# Altium footprint library connectors.PCBLIB: 188 footprints (part 10 of 12)
Each footprint in its own frame and in the unit in brackets; x right, y up, seen from the top. Pads: shape width x height; smd on the part's side, far side on the other; paste and mask are expansions set on the pad; w line width, h text height; cw(c..) or ccw(c..) is an arc to the next point about the centre after c.
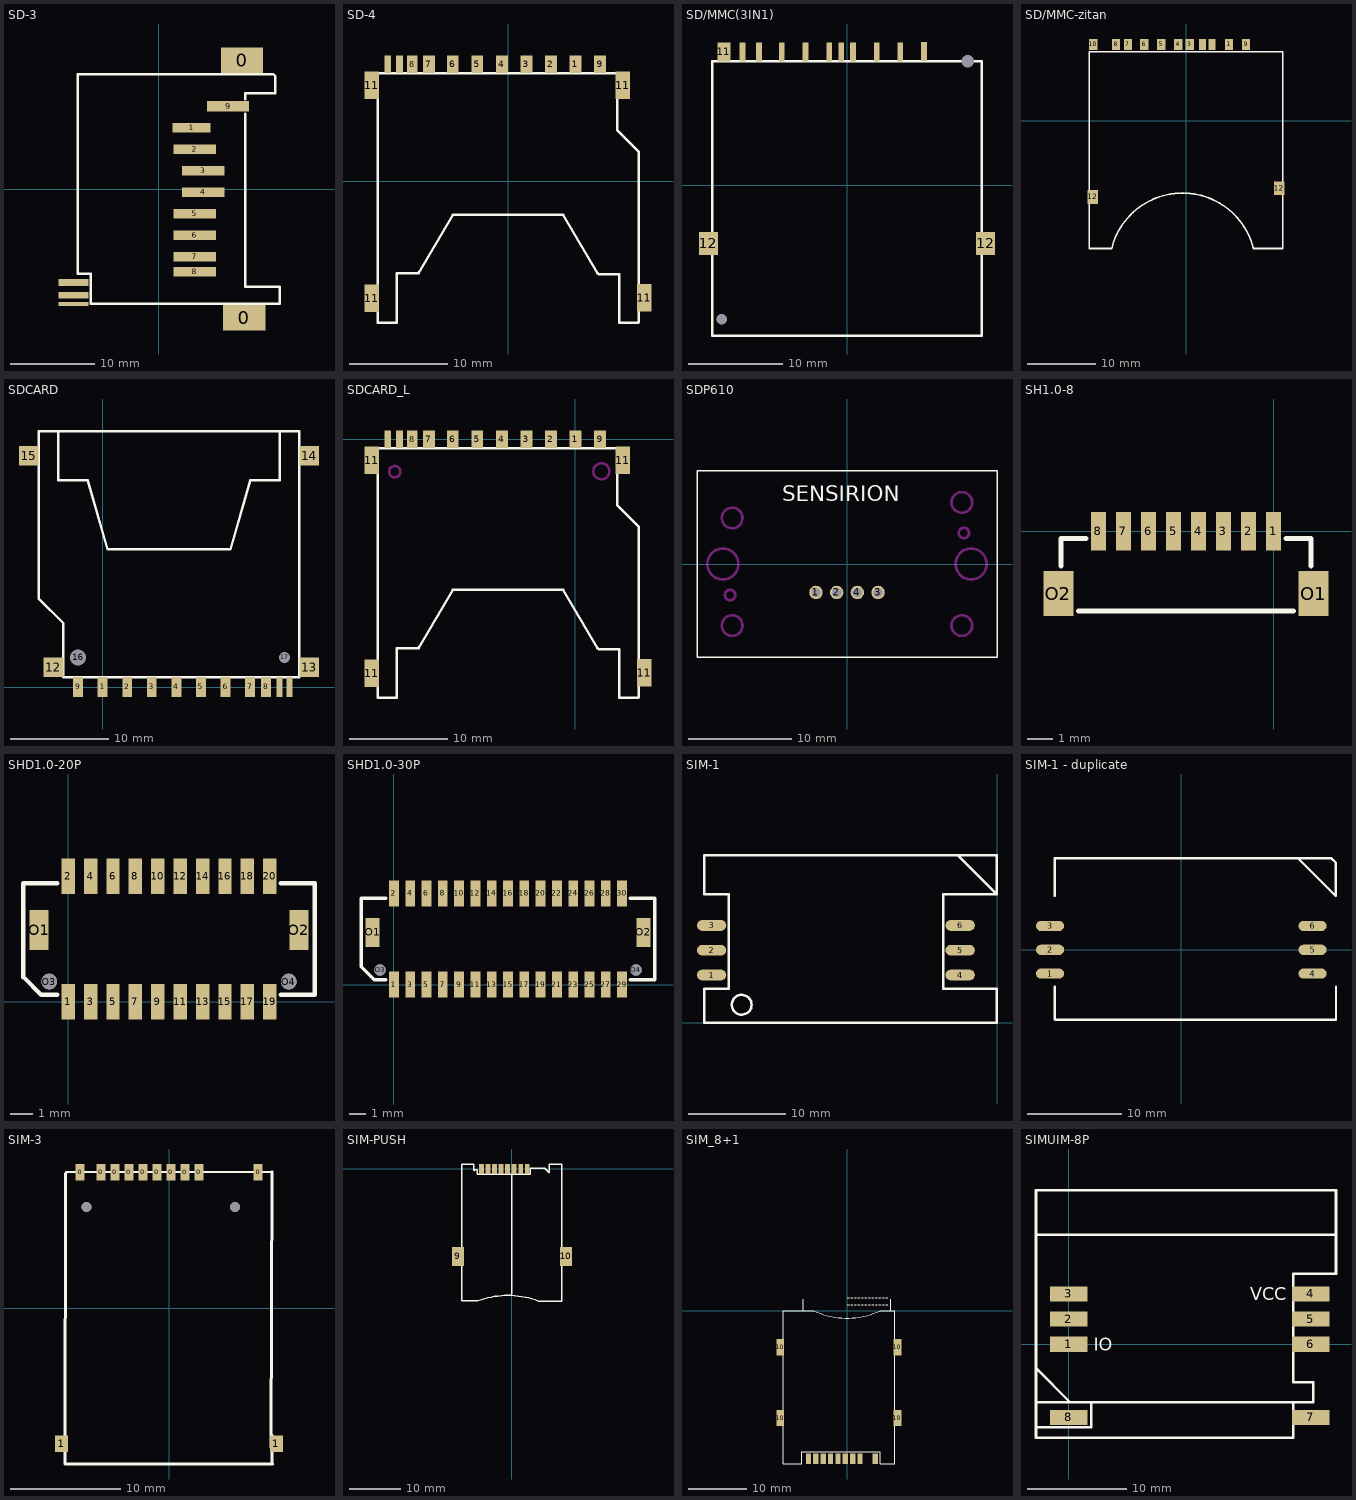
[diagram p9: the footprints below, top view; thin cyan lines are the x and y axes]

## SD-3 [mm]
pads (14):
  rect 5x3 smd: 0(9.843,15.24) 0(10.097,-15.24)
  rect 4.5x1.143 smd: 1(3.874,7.239)
  rect 5x1.143 smd: 2(4.255,4.699) 3(5.271,2.159) 4(5.271,-0.381) 5(4.255,-2.921) 6(4.255,-5.461) 7(4.255,-8.001) 8(4.255,-9.779)
  rect 5x1.27 smd: 9(8.192,9.779)
  rect 3.556x0.8 smd: 10(-10.097,-11.049) 11(-10.097,-12.573)
  rect 3.556x0.5 smd: 12(-10.097,-13.589)
Top Overlay:
  lines w0.3: 7.683,-13.589 14.287,-13.589 14.287,-11.557 10.223,-11.557 10.223,8.889 ; 8.191,-13.589 -8.065,-13.589 -8.065,-10.033 -9.589,-10.033 -9.589,13.589 8.191,13.589 13.525,13.589 13.779,13.335 13.779,11.303 10.223,11.303 10.223,10.59

## SD-4 [mm]
pads (15):
  rect 1.2x1.8 smd: 1(6.858,11.917) 2(4.369,11.917) 3(1.875,11.908) 4(-0.625,11.908) 5(-3.125,11.908) 6(-5.625,11.908) 7(-8.05,11.908) 9(9.375,11.908)
  rect 1.1x1.8 smd: 8(-9.754,11.917)
  rect 0.7x1.8 smd: 10(-11.05,11.908) 12(-12.243,11.917)
  rect 1.5x2.8 smd: 11(-13.868,-11.917) 11(-13.868,9.774) 11(11.684,9.774) 11(13.868,-11.866)
Top Overlay:
  lines w0.254: -11.3,-9.383 -11.3,-14.383 -13.273,-14.383 -13.273,11.003 -13.259,11.017 11.1,11.017 11.1,5.207 13.289,3.018 13.3,3.018 13.3,-14.356 13.273,-14.383 11.3,-14.383 11.3,-9.484 9.258,-9.484 9.1,-9.326 ; -11.249,-9.377 -9.207,-9.377 -9.049,-9.219 ; -9.1,-9.377 -5.588,-3.383 ; -5.6,-3.383 5.6,-3.383 9.1,-9.377
Multi-Layer:
  circle w0.254: c9.5,8.657 r0.82
  circle w0.254: c-11.532,8.617 r0.58

## SD/MMC(3IN1) [mm]
pads (15):
  rect 0.6x2 smd: 1(8.13,14.133) 2(5.63,14.101) 3(3.13,14.101) 4(0.63,14.101) 5(-0.62,14.101) 6(-1.88,14.101) 7(-4.38,14.101) 8(-6.88,14.101) 9(-9.3,14.101) 10(-11.05,14.101)
  rect 1.4x2 smd: 11(-13,14.101)
  rect 2x2.4 smd: 12(-14.65,-6.133) 12(14.65,-6.133)
  round 1.05 hole 1.1: ""(-13.25,-14.133)
  round 1.25 hole 1.3: ""(12.75,13.12)
Top Overlay:
  lines w0.254: -14.251,-15.899 14.249,-15.899 14.249,13.101 -1.251,13.101 -14.251,13.101 -14.251,-15.899

## SD/MMC-zitan [mm]
pads (13):
  rect 1.2x1.6 smd: 1(6.35,11.25) 3(0.55,11.25) 4(-1.15,11.25) 5(-3.65,11.25) 6(-6.15,11.25) 7(-8.575,11.25) 8(-10.3,11.25) 9(8.85,11.25) 10(-13.68,11.25)
  rect 1x1.6 smd: 2(3.85,11.25) 11(2.45,11.25)
  rect 1.5x2 smd: 12(-13.75,-11.25) 12(13.75,-9.95)
Top Overlay:
  lines w0.254: -10.964,-18.871 cw(c-0.508,-21.427) 9.943,-18.85 ; -10.964,-18.85 -14.28,-18.85 -14.28,10.15 14.28,10.15 14.28,-18.85 9.943,-18.85
Multi-Layer:
  circle w0.127: c11.7,-13.35 r0.85
  circle w0.127: c-12.6,-13.35 r0.85

## SDCARD [mm]
pads (17):
  rect 1x2 smd: 1(0.007,0.016) 2(2.507,0.016) 3(5.007,0.016) 4(7.507,0.016) 5(10.007,0.016) 6(12.507,0.016) 7(15.007,0.016) 8(16.632,0.016) 9(-2.493,0.016)
  rect 0.6x2 smd: 10(19.007,0.016) 11(18.007,0.016)
  rect 2x2 smd: 12(-4.993,2.016) 13(21.007,2.016) 14(21.007,23.516) 15(-7.493,23.516)
  round 1.5 hole 1.6: 16(-2.493,3.016)
  round 1 hole 1.1: 17(18.507,3.016)
Top Overlay:
  lines w0.254: -4.493,26.016 -4.493,21.016 -1.493,21.016 0.507,14.016 13.007,14.016 15.007,21.016 18.007,21.016 18.007,26.016 ; -6.493,9.016 -6.493,26.016 20.007,26.016 20.007,1.016 -3.993,1.016 -3.993,6.516 -6.493,9.016

## SDCARD_L [mm]
pads (15):
  rect 1.2x1.8 smd: 1(0,0) 2(-2.489,0) 3(-4.983,-0.009) 4(-7.483,-0.009) 5(-9.983,-0.009) 6(-12.483,-0.009) 7(-14.908,-0.009) 9(2.517,-0.009)
  rect 1.1x1.8 smd: 8(-16.612,0)
  rect 0.7x1.8 smd: 10(-17.908,-0.009) 12(-19.101,0)
  rect 1.5x2.8 smd: 11(-20.726,-23.834) 11(-20.726,-2.143) 11(4.826,-2.143) 11(7.01,-23.784)
Top Overlay:
  lines w0.254: -18.158,-21.3 -18.158,-26.3 -20.131,-26.3 -20.131,-0.914 -20.117,-0.9 4.242,-0.9 4.242,-6.71 6.431,-8.899 6.442,-8.899 6.442,-26.273 6.415,-26.3 4.442,-26.3 4.442,-21.402 2.4,-21.402 2.242,-21.244 ; -18.107,-21.294 -16.065,-21.294 -15.907,-21.136 ; -15.958,-21.294 -12.446,-15.3 ; -12.458,-15.3 -1.258,-15.3 2.242,-21.294
Keep-Out Layer:
  circle w0.254: c2.642,-3.26 r0.82
  circle w0.254: c-18.39,-3.3 r0.58

## SDP610 [mm]
pads (4):
  round 1.3 hole 0.9: 1(-3,-2.75) 2(-1,-2.75) 3(3,-2.75) 4(1,-2.75)
Top Overlay:
  lines w0.127: -14.5,-9 14.5,-9 14.5,9 -14.5,9 -14.5,-9
  text "SENSIRION" at -6.25,6.05 h1.52
Keep-Out Layer:
  circle w0.254: c11.3,3 r0.5
  circle w0.254: c-11.3,-3 r0.5
  circle w0.254: c11.1,-5.95 r1
  circle w0.254: c11.1,5.95 r1
  circle w0.254: c-11.1,4.45 r1
  circle w0.254: c-11.1,-5.95 r1
  circle w0.254: c-12,0 r1.5
  circle w0.254: c12,0 r1.5

## SH1.0-8 [mm]
pads (10):
  rect 0.6x1.55 smd: 1(0,0) 2(-1,0) 3(-2,0) 4(-3,0) 5(-4,0) 6(-5,0) 7(-6,0) 8(-7,0)
  rect 1.2x1.8 smd: O1(1.6,-2.5) O2(-8.6,-2.5)
Top Overlay:
  lines w0.2: -8.5,-1.4 -8.5,-0.3 -7.5,-0.3 ; -7.8,-3.2 0.8,-3.2 ; 0.5,-0.3 1.5,-0.3 1.5,-1.4

## SHD1.0-20P [mm]
pads (24):
  rect 0.6x1.6 smd: 1(0,0) 2(0,5.6) 3(1,0) 4(1,5.6) 5(2,0) 6(2,5.6) 7(3,0) 8(3,5.6) 9(4,0) 10(4,5.6) 11(5,0) 12(5,5.6) 13(6,0) 14(6,5.6) 15(7,0) 16(7,5.6) 17(8,0) 18(8,5.6) 19(9,0) 20(9,5.6)
  rect 0.85x1.8 smd: O1(-1.3,3.2) O2(10.3,3.2)
  round 0.7 hole 0.7: O3(-0.85,0.9) O4(9.85,0.9)
Top Overlay:
  lines w0.2: -0.5,0.3 -0.9,0.3 -1.2,0.3 -2,1.1 ; -0.5,5.3 -1.8,5.3 -2,5.3 -2,1.1 ; 9.5,0.3 11,0.3 11,5.3 9.5,5.3 ; -2,1.1 -2,1.1

## SHD1.0-30P [mm]
pads (34):
  rect 0.6x1.6 smd: 1(0,0) 2(0,5.6) 3(1,0) 4(1,5.6) 5(2,0) 6(2,5.6) 7(3,0) 8(3,5.6) 9(4,0) 10(4,5.6) 11(5,0) 12(5,5.6) 13(6,0) 14(6,5.6) 15(7,0) 16(7,5.6) 17(8,0) 18(8,5.6) 19(9,0) 20(9,5.6) 21(10,0) 22(10,5.6) 23(11,0) 24(11,5.6) 25(12,0) 26(12,5.6) 27(13,0) 28(13,5.6) 29(14,0) 30(14,5.6)
  rect 0.85x1.8 smd: O1(-1.3,3.2) O2(15.3,3.2)
  round 0.7 hole 0.7: O3(-0.85,0.9) O4(14.85,0.9)
Top Overlay:
  lines w0.2: -0.5,0.3 -0.9,0.3 -1.2,0.3 -2,1.1 ; -0.5,5.3 -1.8,5.3 -2,5.3 -2,1.1 ; 14.5,0.3 16,0.3 16,5.3 14.5,5.3 ; -2,1.1 -2,1.1

## SIM-1 [mm]
pads (6):
  oval 3x1.1 smd: 1(-29.23,4.91) 2(-29.23,7.45) 3(-29.23,9.99) 4(-3.77,4.91) 5(-3.77,7.45) 6(-3.77,9.99)
Top Overlay:
  circle w0.254: c-26.152,1.862 r1.016
  lines w0.254: -29.995,0.02 -29.995,3.5 -27.5,3.5 -27.5,13.185 ; -29.975,0 0,0 ; -27.5,13.2 -29.992,13.2 -30,13.208 -30,17.2 -0.033,17.2 -0.033,13.2 ; -5.5,3.5 -5.5,13.2 -0.033,13.2 ; -5.495,3.5 -1.577,3.5 ; -4.033,17.2 -0.033,13.2 ; -1.958,3.5 -0.005,3.5 -0.005,0.005

## SIM-1 - duplicate [mm]
pads (6):
  oval 3x1.1 smd: 1(-14,-2.54) 2(-14,0) 3(-14,2.54) 4(14,-2.54) 5(14,0) 6(14,2.54)
Top Overlay:
  lines w0.254: -13.495,-7.43 -13.495,-3.95 ; -13.492,5.75 -13.5,5.758 -13.5,9.75 16.011,9.75 16.467,9.294 16.467,5.75 12.467,9.75 ; -13.475,-7.45 16.5,-7.45 ; 16.495,-7.445 16.495,-3.95

## SIM-3 [mm]
pads (12):
  rect 0.8x1.5 smd: 0(-8.07,12.325) 0(-6.17,12.325) 0(-4.9,12.325) 0(-3.63,12.325) 0(-2.36,12.325) 0(-1.09,12.325) 0(0.18,12.325) 0(1.45,12.325) 0(2.72,12.325) 0(8.08,12.325)
  rect 1.2x1.5 smd: 1(-9.75,-12.325) 1(9.75,-12.325)
via 6,9.175 diameter 0.9 hole 0.9
via -7.5,9.175 diameter 0.9 hole 0.9
Top Overlay:
  lines w0.254: 7.778,12.325 9.353,12.375 ; 9.251,-12.618 9.353,12.375 ; 9.353,-11.501 9.353,-14.091 9.404,-14.142 8.642,-14.142 -9.443,-14.142 -9.392,12.223 -9.291,12.325 9.353,12.375

## SIM-PUSH [mm]
pads (10):
  rect 0.95x1.9 smd: 1(2.98,0) 2(1.71,0) 3(0.44,0) 4(-0.83,0) 5(-2.1,0) 6(-3.37,0) 7(-4.64,0) 8(-5.91,0)
  rect 2.3x3.7 smd: 9(-10.48,-16.95) 10(10.48,-16.95)
Top Overlay:
  lines w0.254: -9.675,-24.7 -9.675,0.95 -7.366,0.95 -7.366,-0.381 -7.112,-0.127 -6.858,-0.127 -6.731,-0.254 -6.731,-1.016 3.556,-1.016 3.556,-0.127 ; -9.675,-20.6 -9.675,0 -9.675,-25.6 -6.604,-25.6 cw(c-0.756,-40.86) 5.135,-25.616 9.659,-25.616 9.675,-25.6 9.675,0.95 7.366,0.95 7.239,0.823 7.239,-0.762 6.35,0.127 3.556,0.127 3.556,-0.254 ; 0,-24.257 0,-1.016

## SIM_8+1 [mm]
height 6.86
pads (13):
  rect 0.9x1.8 smd: 1(-6.64,-25.52) 2(-5.37,-25.52) 3(-4.1,-25.52) 4(-2.83,-25.52) 5(-1.56,-25.52) 6(-0.29,-25.52) 7(0.98,-25.52) 8(2.25,-25.52) 9(4.85,-25.52)
  rect 1.35x2.8 smd: 10(-11.5,-18.5) 10(-11.5,-6.3) 10(8.7,-18.5) 10(8.7,-6.3)
Top Overlay:
  lines w0.127: -7.5,0 -7.5,2 ; 7.5,0 7.5,2 ; -11,-26.4 -7.8,-26.4 -7.8,-24.3 5.7,-24.3 5.7,-26.4 8.2,-26.4 8.2,0 5.7,0 cw(c0,12) -5.7,0 -11,0 -11,-26.4
  text "------------" at 7.2,3 h2
  text "------------" at 7.2,1.8 h2

## SIMUIM-8P [mil]
pads (8):
  rect 150x60 smd: 1(0.24,-0.35) 2(0.24,99.64) 3(0.24,199.65) 4(960.24,199.65) 5(960.24,99.64) 6(960.24,-0.35) 7(960.24,-290.36) 8(0.24,-290.36)
Top Overlay:
  lines w10: -129.76,-330.36 60.24,-330.36 90.24,-330.36 90.24,-230.35 ; -129.76,-230.35 60.24,-230.35 890.24,-230.35 ; -129.76,434.64 1060.24,434.64 ; 5.24,-230.35 -129.76,-95.36 ; -129.76,-95.36 -129.76,-370.36 890.24,-370.36 890.24,-230.35 ; -129.76,-95.36 -129.76,609.64 1060.24,609.64 1060.24,279.64 890.24,279.64 890.24,-150.35 970.24,-150.35 970.24,-230.35 890.24,-230.35
  text "IO" at 100.24,-25.36 h50
  text "VCC" at 720.24,174.65 h50